# Altium integrated library Lattice CPLD ispLSI.IntLib: 471 symbols (part 17 of 26)
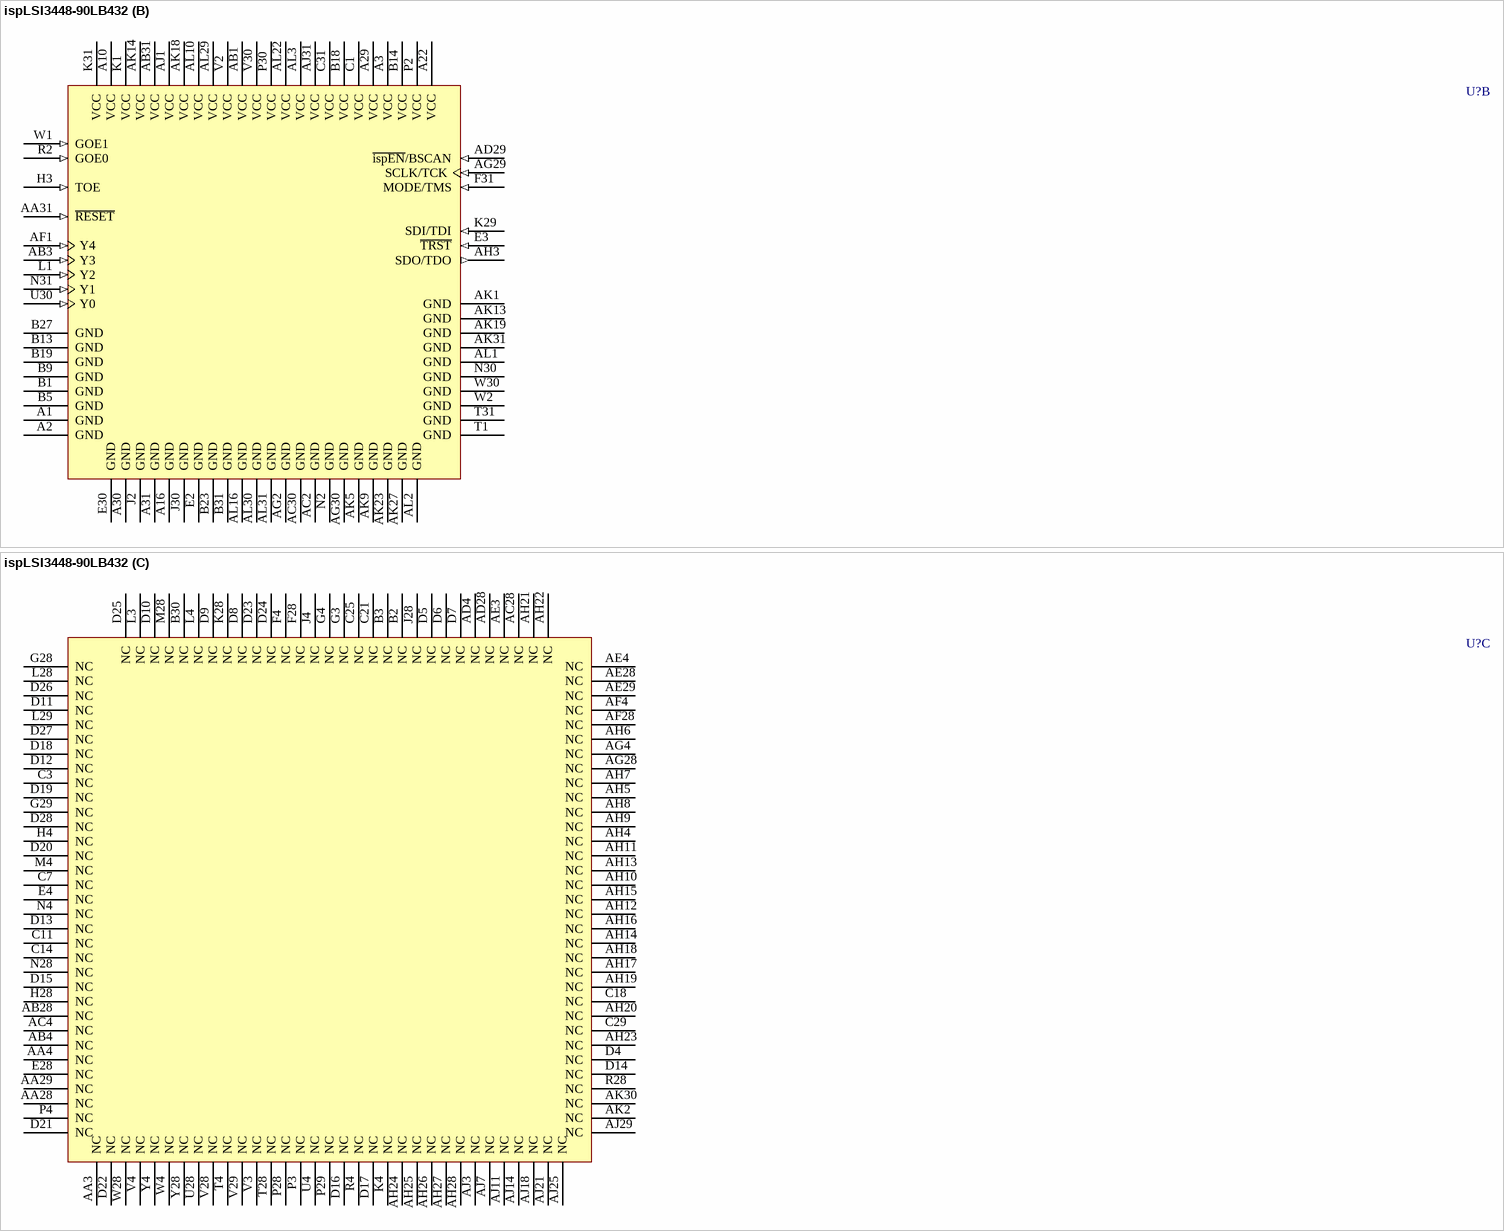
[diagram p247: symbol ispLSI3448-90LB432]

## ispLSI3448-90LB432
designator U?
In-System Programmable High-Density PLD; Published: 23-Sep-2002; LatestRevisionDate: 13-Apr-2006; LatestRevisionNote: IPC-7351 Footprint Added.; DatasheetVersion: Feb-2000; PackageVersion: pkg_32, Aug-2005; PackageReference: SBGA432; Publisher: Altium Limited; PackageDescription: 432-Ball Super Ball Grid Array (SBGA432); ComponentLink1Description: Manufacturer Link; ComponentLink1URL: http://www.latticesemi.com/products/mature/index.cfm; ComponentLink2Description: Datasheet; ComponentLink2URL: http://www.latticesemi.com/lit/docs/datasheets/cpld/3448.pdf
footprint SBGA432 (BGA, 432-Leads, Body 40x40mm, Pitch 1.27mm)
3D model 3448-SBGA432 (432-Ball Super Ball Grid Array (SBGA432))
part A pins: A4 I/O141 (io), A5 I/O142 (io), A6 I/O145 (io), A7 I/O147 (io), A8 I/O150 (io), A9 I/O152 (io), A11 I/O156 (io), A12 I/O159 (io), A13 I/O161 (io), A14 I/O162 (io), A15 I/O165 (io), A17 I/O170 (io), A18 I/O171 (io), A19 I/O172 (io), A20 I/O174 (io), A21 I/O177 (io), A23 I/O181 (io), A24 I/O183 (io), A25 I/O186 (io), A26 I/O188 (io), A27 I/O191 (io), A28 I/O192 (io), AA1 I/O102 (io), AA2 I/O101 (io), AA30 I/O9 (io), AB2 I/O100 (io), AB29 I/O11 (io), AB30 I/O10 (io), AC1 I/O99 (io), AC3 I/O98 (io), AC29 I/O13 (io), AC31 I/O12 (io), AD1 I/O97 (io), AD2 I/O96 (io), AD3 I/O95 (io), AD30 I/O15 (io), AD31 I/O14 (io), AE1 I/O94 (io), AE2 I/O93 (io), AE30 I/O17 (io), AE31 I/O16 (io), AF2 I/O92 (io), AF3 I/O91 (io), AF29 I/O20 (io), AF30 I/O19 (io), AF31 I/O18 (io), AG1 I/O90 (io), AG3 I/O88 (io), AG31 I/O21 (io), AH1 I/O89 (io), AH2 I/O87 (io), AH29 I/O25 (io), AH30 I/O23 (io), AH31 I/O22 (io), AJ2 I/O86 (io), AJ4 I/O85 (io), AJ5 I/O82 (io), AJ6 I/O79 (io), AJ8 I/O74 (io), AJ9 I/O71 (io), AJ10 I/O69 (io), AJ12 I/O65 (io), AJ13 I/O62 (io), AJ15 I/O57 (io), AJ16 I/O55 (io), AJ17 I/O52 (io), AJ19 I/O49 (io), AJ20 I/O46 (io), AJ22 I/O42 (io), AJ23 I/O40 (io), AJ24 I/O37 (io), AJ26 I/O32 (io), AJ27 I/O29 (io), AJ28 I/O26 (io), AJ30 I/O24 (io), AK3 I/O84 (io), AK4 I/O83 (io), AK6 I/O78 (io), AK7 I/O76 (io), AK8 I/O73 (io), AK10 I/O68 (io), AK11 I/O67 (io), AK12 I/O64 (io), AK15 I/O58 (io), AK16 I/O56 (io), AK17 I/O53 (io), AK20 I/O47 (io), AK21 I/O44 (io), AK22 I/O43 (io), AK24 I/O38 (io), AK25 I/O35 (io), AK26 I/O33 (io), AK28 I/O28 (io), AK29 I/O27 (io), AL4 I/O81 (io), AL5 I/O80 (io), AL6 I/O77 (io), AL7 I/O75 (io), AL8 I/O72 (io), AL9 I/O70 (io), AL11 I/O66 (io), AL12 I/O63 (io), AL13 I/O61 (io), AL14 I/O60 (io), AL15 I/O59 (io), AL17 I/O54 (io), AL18 I/O51 (io), AL19 I/O50 (io), AL20 I/O48 (io), AL21 I/O45 (io), AL23 I/O41 (io), AL24 I/O39 (io), AL25 I/O36 (io), AL26 I/O34 (io), AL27 I/O31 (io), AL28 I/O30 (io), B4 I/O139 (io), B6 I/O144 (io), B7 I/O146 (io), B8 I/O149 (io), B10 I/O154 (io), B11 I/O155 (io), B12 I/O158 (io), B15 I/O164 (io), B16 I/O167 (io), B17 I/O169 (io), B20 I/O175 (io), B21 I/O178 (io), B22 I/O179 (io), B24 I/O184 (io), B25 I/O187 (io), B26 I/O189 (io), B28 I/O194 (io), B29 I/O195 (io), C2 I/O136 (io), C4 I/O138 (io), C5 I/O140 (io), C6 I/O143 (io), C8 I/O148 (io), C9 I/O151 (io), C10 I/O153 (io), C12 I/O157 (io), C13 I/O160 (io), C15 I/O163 (io), C16 I/O166 (io), C17 I/O168 (io), C19 I/O173 (io), C20 I/O176 (io), C22 I/O180 (io), C23 I/O182 (io), C24 I/O185 (io), C26 I/O190 (io), C27 I/O193 (io), C28 I/O196 (io), C30 I/O198 (io), D1 I/O134 (io), D2 I/O135 (io), D3 I/O137 (io), D29 I/O197 (io), D30 I/O199 (io), D31 I/O201 (io), E1 I/O133 (io), E29 I/O200 (io), E31 I/O202 (io), F1 I/O130 (io), F2 I/O131 (io), F3 I/O132 (io), F29 I/O203 (io), F30 I/O204 (io), G1 I/O128 (io), G2 I/O129 (io), G30 I/O205 (io), G31 I/O206 (io), H1 I/O126 (io), H2 I/O127 (io), H29 I/O207 (io), H30 I/O208 (io), H31 I/O209 (io), J1 I/O124 (io), J3 I/O125 (io), J29 I/O210 (io), J31 I/O211 (io), K2 I/O122 (io), K3 I/O123 (io), K30 I/O212 (io), L2 I/O121 (io), L30 I/O213 (io), L31 I/O214 (io), M1 I/O118 (io), M2 I/O119 (io), M3 I/O120 (io), M29 I/O215 (io), M30 I/O216 (io), M31 I/O217 (io), N1 I/O116 (io), N3 I/O117 (io), N29 I/O218 (io), P1 I/O115 (io), P31 I/O219 (io), R1 I/O114 (io), R3 I/O113 (io), R29 I/O220 (io), R30 I/O221 (io), R31 I/O222 (io), T2 I/O112 (io), T3 I/O111 (io), T29 I/O223 (io), T30 I/O0 (io), U1 I/O110 (io), U2 I/O109 (io), U3 I/O108 (io), U29 I/O1 (io), U31 I/O2 (io), V1 I/O107 (io), V31 I/O3 (io), W3 I/O106 (io), W29 I/O5 (io), W31 I/O4 (io), Y1 I/O105 (io), Y2 I/O104 (io), Y3 I/O103 (io), Y29 I/O8 (io), Y30 I/O7 (io), Y31 I/O6 (io)
part B pins: A1 GND (power), A2 GND (power), A3 VCC (power), A10 VCC (power), A16 GND (power), A22 VCC (power), A29 VCC (power), A30 GND (power), A31 GND (power), AA31 ~{RESET} (in), AB1 VCC (power), AB3 Y3 (in), AB31 VCC (power), AC2 GND (power), AC30 GND (power), AD29 ~{ispEN}/BSCAN (in), AF1 Y4 (in), AG2 GND (power), AG29 SCLK/TCK (in), AG30 GND (power), AH3 SDO/TDO (out), AJ1 VCC (power), AJ31 VCC (power), AK1 GND (power), AK5 GND (power), AK9 GND (power), AK13 GND (power), AK14 VCC (power), AK18 VCC (power), AK19 GND (power), AK23 GND (power), AK27 GND (power), AK31 GND (power), AL1 GND (power), AL2 GND (power), AL3 VCC (power), AL10 VCC (power), AL16 GND (power), AL22 VCC (power), AL29 VCC (power), AL30 GND (power), AL31 GND (power), B1 GND (power), B5 GND (power), B9 GND (power), B13 GND (power), B14 VCC (power), B18 VCC (power), B19 GND (power), B23 GND (power), B27 GND (power), B31 GND (power), C1 VCC (power), C31 VCC (power), E2 GND (power), E3 ~{TRST} (in), E30 GND (power), F31 MODE/TMS (in), H3 TOE (in), J2 GND (power), J30 GND (power), K1 VCC (power), K29 SDI/TDI (in), K31 VCC (power), L1 Y2 (in), N2 GND (power), N30 GND (power), N31 Y1 (in), P2 VCC (power), P30 VCC (power), R2 GOE0 (in), T1 GND (power), T31 GND (power), U30 Y0 (in), V2 VCC (power), V30 VCC (power), W1 GOE1 (in), W2 GND (power), W30 GND (power)
part C pins: AA3 NC, AA4 NC, AA28 NC, AA29 NC, AB4 NC, AB28 NC, AC4 NC, AC28 NC, AD4 NC, AD28 NC, AE3 NC, AE4 NC, AE28 NC, AE29 NC, AF4 NC, AF28 NC, AG4 NC, AG28 NC, AH4 NC, AH5 NC, AH6 NC, AH7 NC, AH8 NC, AH9 NC, AH10 NC, AH11 NC, AH12 NC, AH13 NC, AH14 NC, AH15 NC, AH16 NC, AH17 NC, AH18 NC, AH19 NC, AH20 NC, AH21 NC, AH22 NC, AH23 NC, AH24 NC, AH25 NC, AH26 NC, AH27 NC, AH28 NC, AJ3 NC, AJ7 NC, AJ11 NC, AJ14 NC, AJ18 NC, AJ21 NC, AJ25 NC, AJ29 NC, AK2 NC, AK30 NC, B2 NC, B3 NC, B30 NC, C3 NC, C7 NC, C11 NC, C14 NC, C18 NC, C21 NC, C25 NC, C29 NC, D4 NC, D5 NC, D6 NC, D7 NC, D8 NC, D9 NC, D10 NC, D11 NC, D12 NC, D13 NC, D14 NC, D15 NC, D16 NC, D17 NC, D18 NC, D19 NC, D20 NC, D21 NC, D22 NC, D23 NC, D24 NC, D25 NC, D26 NC, D27 NC, D28 NC, E4 NC, E28 NC, F4 NC, F28 NC, G3 NC, G4 NC, G28 NC, G29 NC, H4 NC, H28 NC, J4 NC, J28 NC, K4 NC, K28 NC, L3 NC, L4 NC, L28 NC, L29 NC, M4 NC, M28 NC, N4 NC, N28 NC, P3 NC, P4 NC, P28 NC, P29 NC, R4 NC, R28 NC, T4 NC, T28 NC, U4 NC, U28 NC, V3 NC, V4 NC, V28 NC, V29 NC, W4 NC, W28 NC, Y4 NC, Y28 NC
part A text: N; M; L; K; A; J; B; I; C; H; D; E; F; G

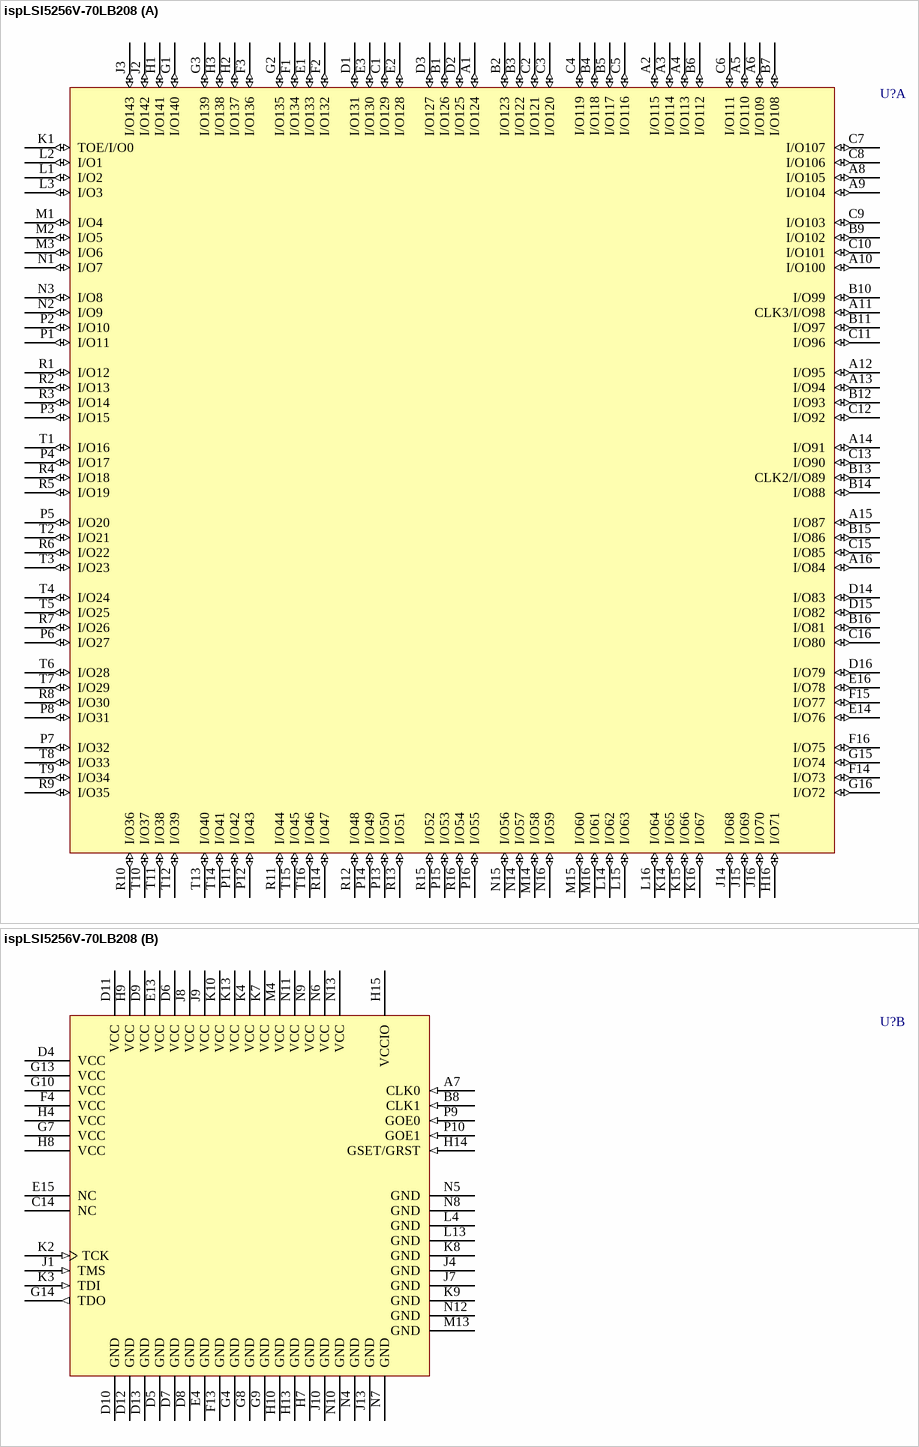
[diagram p159: symbol ispLSI5256V-70LB208]

## ispLSI5256V-70LB208
designator U?
In-System Programmable 3.3V SuperWIDE High-Density PLD; Note: I/O89 is multiplexed with CLK2; I/O98 is multiplexed with CLK3; I/O0 is multiplexed with TOE.; Published: 23-Sep-2002; LatestRevisionDate: 13-Apr-2006; LatestRevisionNote: IPC-7351 Footprint Added.; DatasheetVersion: May-1999; PackageVersion: pkg_32, Aug-2005; PackageReference: fpBGA208; Publisher: Altium Limited; PackageDescription: 208-Ball Fine Pitch Ball Grid Array (fpBGA208); ComponentLink1Description: Manufacturer Link; ComponentLink1URL: http://www.latticesemi.com/products/mature/index.cfm; ComponentLink2Description: Datasheet; ComponentLink2URL: http://www.latticesemi.com/account/_download.cfm?AMID=1164
footprint fpBGA208 (BGA, 208-Leads, Body 17x17mm, Pitch 1mm)
3D model 5256V-fpBGA208 (208-Ball Fine Pitch Ball Grid Array (fpBGA208))
part A pins: A1 I/O124 (io), A2 I/O115 (io), A3 I/O114 (io), A4 I/O113 (io), A5 I/O110 (io), A6 I/O109 (io), A8 I/O105 (io), A9 I/O104 (io), A10 I/O100 (io), A11 CLK3/I/O98 (io), A12 I/O95 (io), A13 I/O94 (io), A14 I/O91 (io), A15 I/O87 (io), A16 I/O84 (io), B1 I/O126 (io), B2 I/O123 (io), B3 I/O122 (io), B4 I/O118 (io), B5 I/O117 (io), B6 I/O112 (io), B7 I/O108 (io), B9 I/O102 (io), B10 I/O99 (io), B11 I/O97 (io), B12 I/O93 (io), B13 CLK2/I/O89 (io), B14 I/O88 (io), B15 I/O86 (io), B16 I/O81 (io), C1 I/O129 (io), C2 I/O121 (io), C3 I/O120 (io), C4 I/O119 (io), C5 I/O116 (io), C6 I/O111 (io), C7 I/O107 (io), C8 I/O106 (io), C9 I/O103 (io), C10 I/O101 (io), C11 I/O96 (io), C12 I/O92 (io), C13 I/O90 (io), C15 I/O85 (io), C16 I/O80 (io), D1 I/O131 (io), D2 I/O125 (io), D3 I/O127 (io), D14 I/O83 (io), D15 I/O82 (io), D16 I/O79 (io), E1 I/O133 (io), E2 I/O128 (io), E3 I/O130 (io), E14 I/O76 (io), E16 I/O78 (io), F1 I/O134 (io), F2 I/O132 (io), F3 I/O136 (io), F14 I/O73 (io), F15 I/O77 (io), F16 I/O75 (io), G1 I/O140 (io), G2 I/O135 (io), G3 I/O139 (io), G15 I/O74 (io), G16 I/O72 (io), H1 I/O141 (io), H2 I/O137 (io), H3 I/O138 (io), H16 I/O71 (io), J2 I/O142 (io), J3 I/O143 (io), J14 I/O68 (io), J15 I/O69 (io), J16 I/O70 (io), K1 TOE/I/O0 (io), K14 I/O65 (io), K15 I/O66 (io), K16 I/O67 (io), L1 I/O2 (io), L2 I/O1 (io), L3 I/O3 (io), L14 I/O62 (io), L15 I/O63 (io), L16 I/O64 (io), M1 I/O4 (io), M2 I/O5 (io), M3 I/O6 (io), M14 I/O58 (io), M15 I/O60 (io), M16 I/O61 (io), N1 I/O7 (io), N2 I/O9 (io), N3 I/O8 (io), N14 I/O57 (io), N15 I/O56 (io), N16 I/O59 (io), P1 I/O11 (io), P2 I/O10 (io), P3 I/O15 (io), P4 I/O17 (io), P5 I/O20 (io), P6 I/O27 (io), P7 I/O32 (io), P8 I/O31 (io), P11 I/O42 (io), P12 I/O43 (io), P13 I/O50 (io), P14 I/O49 (io), P15 I/O53 (io), P16 I/O55 (io), R1 I/O12 (io), R2 I/O13 (io), R3 I/O14 (io), R4 I/O18 (io), R5 I/O19 (io), R6 I/O22 (io), R7 I/O26 (io), R8 I/O30 (io), R9 I/O35 (io), R10 I/O36 (io), R11 I/O44 (io), R12 I/O48 (io), R13 I/O51 (io), R14 I/O47 (io), R15 I/O52 (io), R16 I/O54 (io), T1 I/O16 (io), T2 I/O21 (io), T3 I/O23 (io), T4 I/O24 (io), T5 I/O25 (io), T6 I/O28 (io), T7 I/O29 (io), T8 I/O33 (io), T9 I/O34 (io), T10 I/O37 (io), T11 I/O38 (io), T12 I/O39 (io), T13 I/O40 (io), T14 I/O41 (io), T15 I/O45 (io), T16 I/O46 (io)
part B pins: A7 CLK0 (in), B8 CLK1 (in), C14 NC, D4 VCC (power), D5 GND (power), D6 VCC (power), D7 GND (power), D8 GND (power), D9 VCC (power), D10 GND (power), D11 VCC (power), D12 GND (power), D13 GND (power), E4 GND (power), E13 VCC (power), E15 NC, F4 VCC (power), F13 GND (power), G4 GND (power), G7 VCC (power), G8 GND (power), G9 GND (power), G10 VCC (power), G13 VCC (power), G14 TDO (out), H4 VCC (power), H7 GND (power), H8 VCC (power), H9 VCC (power), H10 GND (power), H13 GND (power), H14 GSET/GRST (in), H15 VCCIO (power), J1 TMS (in), J4 GND (power), J7 GND (power), J8 VCC (power), J9 VCC (power), J10 GND (power), J13 GND (power), K2 TCK (in), K3 TDI (in), K4 VCC (power), K7 VCC (power), K8 GND (power), K9 GND (power), K10 VCC (power), K13 VCC (power), L4 GND (power), L13 GND (power), M4 VCC (power), M13 GND (power), N4 GND (power), N5 GND (power), N6 VCC (power), N7 GND (power), N8 GND (power), N9 VCC (power), N10 GND (power), N11 VCC (power), N12 GND (power), N13 VCC (power), P9 GOE0 (in), P10 GOE1 (in)

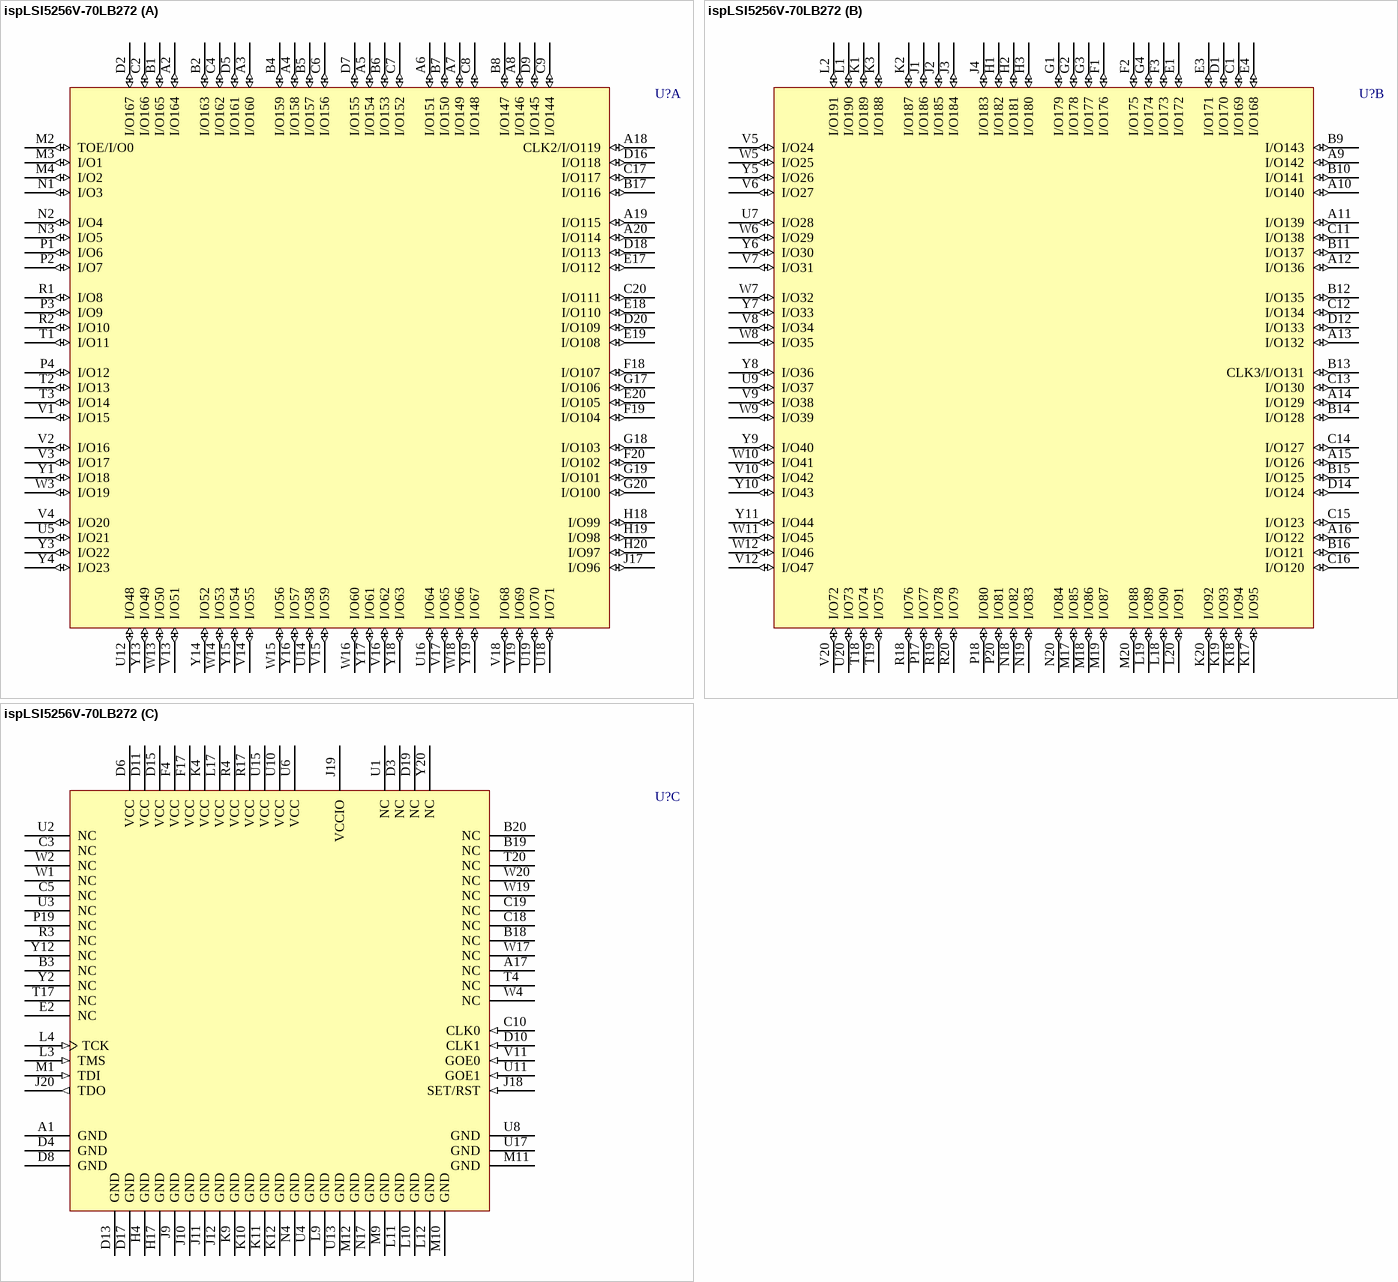
[diagram p160: symbol ispLSI5256V-70LB272]

## ispLSI5256V-70LB272
designator U?
In-System Programmable 3.3V SuperWIDE High-Density PLD; Note: I/O119 is multiplexed with CLK2; I/O131 is multiplexed with CLK3; I/O0 is multiplexed with TOE.; Published: 23-Sep-2002; LatestRevisionDate: 13-Apr-2006; LatestRevisionNote: IPC-7351 Footprint Added.; DatasheetVersion: May-1999; PackageVersion: pkg_32, Aug-2005; PackageReference: BGA272; Publisher: Altium Limited; PackageDescription: 272-Ball Ball Grid Array (BGA272); ComponentLink1Description: Manufacturer Link; ComponentLink1URL: http://www.latticesemi.com/products/mature/index.cfm; ComponentLink2Description: Datasheet; ComponentLink2URL: http://www.latticesemi.com/account/_download.cfm?AMID=1164
footprint BGA272 (BGA, 272-Leads, Body 27x27mm, Pitch 1.27mm)
3D model 5256V-BGA272 (272-Ball Ball Grid Array (BGA272))
part A pins: A2 I/O164 (io), A3 I/O160 (io), A4 I/O158 (io), A5 I/O154 (io), A6 I/O151 (io), A7 I/O149 (io), A8 I/O146 (io), A18 CLK2/I/O119 (io), A19 I/O115 (io), A20 I/O114 (io), B1 I/O165 (io), B2 I/O163 (io), B4 I/O159 (io), B5 I/O157 (io), B6 I/O153 (io), B7 I/O150 (io), B8 I/O147 (io), B17 I/O116 (io), C2 I/O166 (io), C4 I/O162 (io), C6 I/O156 (io), C7 I/O152 (io), C8 I/O148 (io), C9 I/O144 (io), C17 I/O117 (io), C20 I/O111 (io), D2 I/O167 (io), D5 I/O161 (io), D7 I/O155 (io), D9 I/O145 (io), D16 I/O118 (io), D18 I/O113 (io), D20 I/O109 (io), E17 I/O112 (io), E18 I/O110 (io), E19 I/O108 (io), E20 I/O105 (io), F18 I/O107 (io), F19 I/O104 (io), F20 I/O102 (io), G17 I/O106 (io), G18 I/O103 (io), G19 I/O101 (io), G20 I/O100 (io), H18 I/O99 (io), H19 I/O98 (io), H20 I/O97 (io), J17 I/O96 (io), M2 TOE/I/O0 (io), M3 I/O1 (io), M4 I/O2 (io), N1 I/O3 (io), N2 I/O4 (io), N3 I/O5 (io), P1 I/O6 (io), P2 I/O7 (io), P3 I/O9 (io), P4 I/O12 (io), R1 I/O8 (io), R2 I/O10 (io), T1 I/O11 (io), T2 I/O13 (io), T3 I/O14 (io), U5 I/O21 (io), U12 I/O48 (io), U14 I/O58 (io), U16 I/O64 (io), U18 I/O71 (io), U19 I/O70 (io), V1 I/O15 (io), V2 I/O16 (io), V3 I/O17 (io), V4 I/O20 (io), V13 I/O51 (io), V14 I/O55 (io), V15 I/O59 (io), V16 I/O62 (io), V17 I/O65 (io), V18 I/O68 (io), V19 I/O69 (io), W3 I/O19 (io), W13 I/O50 (io), W14 I/O53 (io), W15 I/O56 (io), W16 I/O60 (io), W18 I/O66 (io), Y1 I/O18 (io), Y3 I/O22 (io), Y4 I/O23 (io), Y13 I/O49 (io), Y14 I/O52 (io), Y15 I/O54 (io), Y16 I/O57 (io), Y17 I/O61 (io), Y18 I/O63 (io), Y19 I/O67 (io)
part B pins: A9 I/O142 (io), A10 I/O140 (io), A11 I/O139 (io), A12 I/O136 (io), A13 I/O132 (io), A14 I/O129 (io), A15 I/O126 (io), A16 I/O122 (io), B9 I/O143 (io), B10 I/O141 (io), B11 I/O137 (io), B12 I/O135 (io), B13 CLK3/I/O131 (io), B14 I/O128 (io), B15 I/O125 (io), B16 I/O121 (io), C1 I/O169 (io), C11 I/O138 (io), C12 I/O134 (io), C13 I/O130 (io), C14 I/O127 (io), C15 I/O123 (io), C16 I/O120 (io), D1 I/O170 (io), D12 I/O133 (io), D14 I/O124 (io), E1 I/O172 (io), E3 I/O171 (io), E4 I/O168 (io), F1 I/O176 (io), F2 I/O175 (io), F3 I/O173 (io), G1 I/O179 (io), G2 I/O178 (io), G3 I/O177 (io), G4 I/O174 (io), H1 I/O182 (io), H2 I/O181 (io), H3 I/O180 (io), J1 I/O186 (io), J2 I/O185 (io), J3 I/O184 (io), J4 I/O183 (io), K1 I/O189 (io), K2 I/O187 (io), K3 I/O188 (io), K17 I/O95 (io), K18 I/O94 (io), K19 I/O93 (io), K20 I/O92 (io), L1 I/O190 (io), L2 I/O191 (io), L18 I/O90 (io), L19 I/O89 (io), L20 I/O91 (io), M17 I/O85 (io), M18 I/O86 (io), M19 I/O87 (io), M20 I/O88 (io), N18 I/O82 (io), N19 I/O83 (io), N20 I/O84 (io), P17 I/O77 (io), P18 I/O80 (io), P20 I/O81 (io), R18 I/O76 (io), R19 I/O78 (io), R20 I/O79 (io), T18 I/O74 (io), T19 I/O75 (io), U7 I/O28 (io), U9 I/O37 (io), U20 I/O73 (io), V5 I/O24 (io), V6 I/O27 (io), V7 I/O31 (io), V8 I/O34 (io), V9 I/O38 (io), V10 I/O42 (io), V12 I/O47 (io), V20 I/O72 (io), W5 I/O25 (io), W6 I/O29 (io), W7 I/O32 (io), W8 I/O35 (io), W9 I/O39 (io), W10 I/O41 (io), W11 I/O45 (io), W12 I/O46 (io), Y5 I/O26 (io), Y6 I/O30 (io), Y7 I/O33 (io), Y8 I/O36 (io), Y9 I/O40 (io), Y10 I/O43 (io), Y11 I/O44 (io)
part C pins: A1 GND (power), A17 NC, B3 NC, B18 NC, B19 NC, B20 NC, C3 NC, C5 NC, C10 CLK0 (in), C18 NC, C19 NC, D3 NC, D4 GND (power), D6 VCC (power), D8 GND (power), D10 CLK1 (in), D11 VCC (power), D13 GND (power), D15 VCC (power), D17 GND (power), D19 NC, E2 NC, F4 VCC (power), F17 VCC (power), H4 GND (power), H17 GND (power), J9 GND (power), J10 GND (power), J11 GND (power), J12 GND (power), J18 SET/RST (in), J19 VCCIO (power), J20 TDO (out), K4 VCC (power), K9 GND (power), K10 GND (power), K11 GND (power), K12 GND (power), L3 TMS (in), L4 TCK (in), L9 GND (power), L10 GND (power), L11 GND (power), L12 GND (power), L17 VCC (power), M1 TDI (in), M9 GND (power), M10 GND (power), M11 GND (power), M12 GND (power), N4 GND (power), N17 GND (power), P19 NC, R3 NC, R4 VCC (power), R17 VCC (power), T4 NC, T17 NC, T20 NC, U1 NC, U2 NC, U3 NC, U4 GND (power), U6 VCC (power), U8 GND (power), U10 VCC (power), U11 GOE1 (in), U13 GND (power), U15 VCC (power), U17 GND (power), V11 GOE0 (in), W1 NC, W2 NC, W4 NC, W17 NC, W19 NC, W20 NC, Y2 NC, Y12 NC, Y20 NC

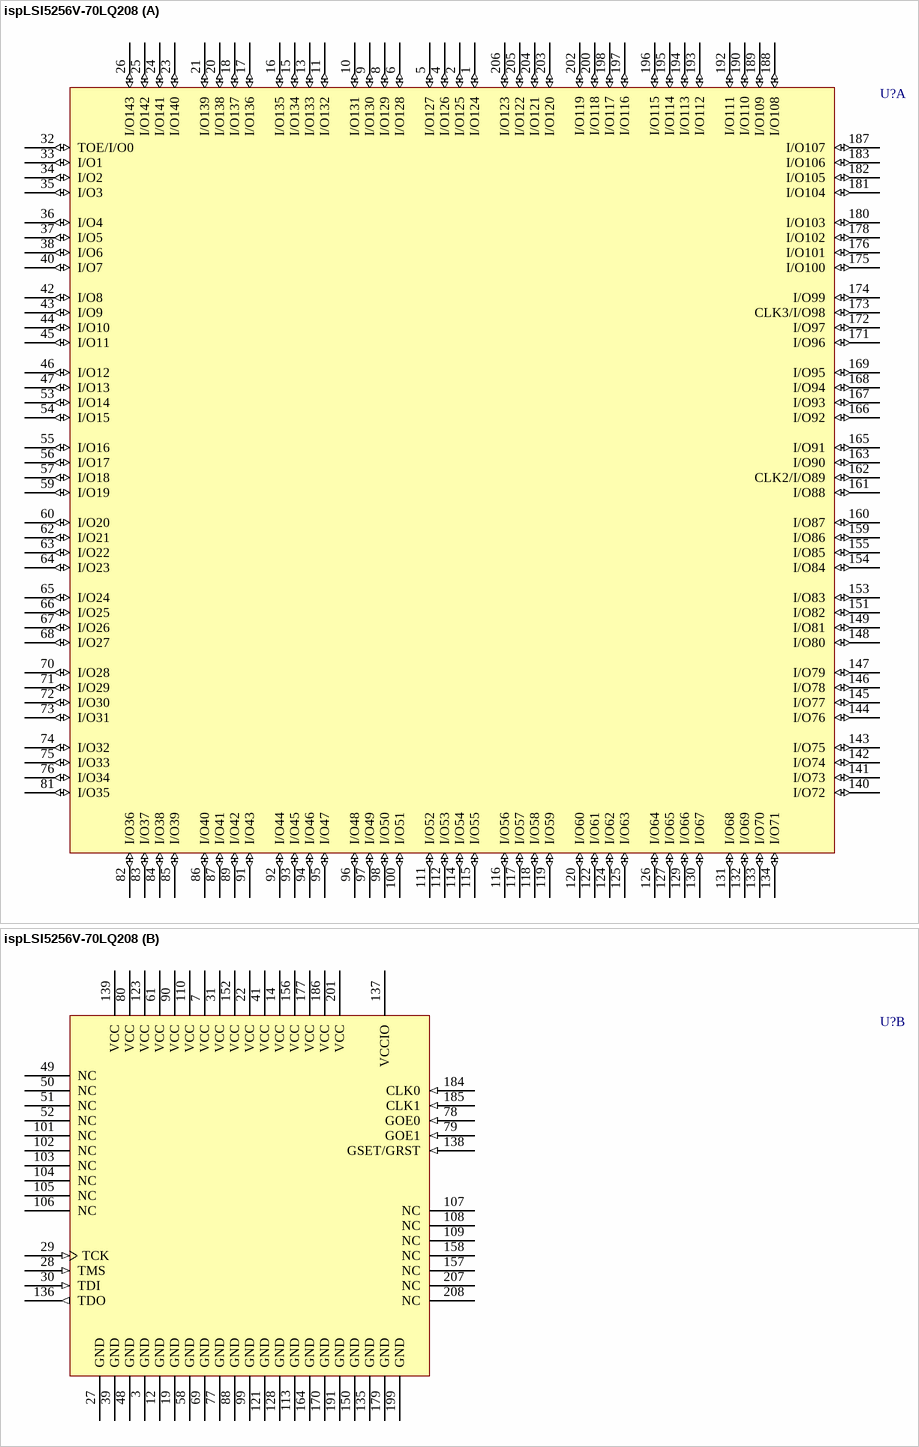
[diagram p161: symbol ispLSI5256V-70LQ208]

## ispLSI5256V-70LQ208
designator U?
In-System Programmable 3.3V SuperWIDE High-Density PLD; Note: I/O89 is multiplexed with CLK2; I/O98 is multiplexed with CLK3; I/O0 is multiplexed with TOE.; Published: 23-Sep-2002; LatestRevisionDate: 13-Apr-2006; LatestRevisionNote: IPC-7351 Footprint Added.; DatasheetVersion: May-1999; PackageVersion: pkg_32, Aug-2005; PackageReference: PQFP208; Publisher: Altium Limited; PackageDescription: 208-Pin Plastic Quad Flat Pack (PQFP208); Code_JEDEC: MO-143-FAI; ComponentLink1Description: Manufacturer Link; ComponentLink1URL: http://www.latticesemi.com/products/mature/index.cfm; ComponentLink2Description: Datasheet; ComponentLink2URL: http://www.latticesemi.com/account/_download.cfm?AMID=1164
footprint PQFP208_N (Shrink QFP, 208-Leads, Body 28x28mm, Pitch 0.5mm, IPC Medium Density)
footprint PQFP208_L (Shrink QFP, 208-Leads, Body 28x28mm, Pitch 0.5mm, IPC High Density)
footprint PQFP208_M (Shrink QFP, 208-Leads, Body 28x28mm, Pitch 0.5mm, IPC Low Density)
3D model 5256V-PQFP208 (208-Pin Plastic Quad Flat Pack (PQFP208))
part A pins: 1 I/O124 (io), 2 I/O125 (io), 4 I/O126 (io), 5 I/O127 (io), 6 I/O128 (io), 8 I/O129 (io), 9 I/O130 (io), 10 I/O131 (io), 11 I/O132 (io), 13 I/O133 (io), 15 I/O134 (io), 16 I/O135 (io), 17 I/O136 (io), 18 I/O137 (io), 20 I/O138 (io), 21 I/O139 (io), 23 I/O140 (io), 24 I/O141 (io), 25 I/O142 (io), 26 I/O143 (io), 32 TOE/I/O0 (io), 33 I/O1 (io), 34 I/O2 (io), 35 I/O3 (io), 36 I/O4 (io), 37 I/O5 (io), 38 I/O6 (io), 40 I/O7 (io), 42 I/O8 (io), 43 I/O9 (io), 44 I/O10 (io), 45 I/O11 (io), 46 I/O12 (io), 47 I/O13 (io), 53 I/O14 (io), 54 I/O15 (io), 55 I/O16 (io), 56 I/O17 (io), 57 I/O18 (io), 59 I/O19 (io), 60 I/O20 (io), 62 I/O21 (io), 63 I/O22 (io), 64 I/O23 (io), 65 I/O24 (io), 66 I/O25 (io), 67 I/O26 (io), 68 I/O27 (io), 70 I/O28 (io), 71 I/O29 (io), 72 I/O30 (io), 73 I/O31 (io), 74 I/O32 (io), 75 I/O33 (io), 76 I/O34 (io), 81 I/O35 (io), 82 I/O36 (io), 83 I/O37 (io), 84 I/O38 (io), 85 I/O39 (io), 86 I/O40 (io), 87 I/O41 (io), 89 I/O42 (io), 91 I/O43 (io), 92 I/O44 (io), 93 I/O45 (io), 94 I/O46 (io), 95 I/O47 (io), 96 I/O48 (io), 97 I/O49 (io), 98 I/O50 (io), 100 I/O51 (io), 111 I/O52 (io), 112 I/O53 (io), 114 I/O54 (io), 115 I/O55 (io), 116 I/O56 (io), 117 I/O57 (io), 118 I/O58 (io), 119 I/O59 (io), 120 I/O60 (io), 122 I/O61 (io), 124 I/O62 (io), 125 I/O63 (io), 126 I/O64 (io), 127 I/O65 (io), 129 I/O66 (io), 130 I/O67 (io), 131 I/O68 (io), 132 I/O69 (io), 133 I/O70 (io), 134 I/O71 (io), 140 I/O72 (io), 141 I/O73 (io), 142 I/O74 (io), 143 I/O75 (io), 144 I/O76 (io), 145 I/O77 (io), 146 I/O78 (io), 147 I/O79 (io), 148 I/O80 (io), 149 I/O81 (io), 151 I/O82 (io), 153 I/O83 (io), 154 I/O84 (io), 155 I/O85 (io), 159 I/O86 (io), 160 I/O87 (io), 161 I/O88 (io), 162 CLK2/I/O89 (io), 163 I/O90 (io), 165 I/O91 (io), 166 I/O92 (io), 167 I/O93 (io), 168 I/O94 (io), 169 I/O95 (io), 171 I/O96 (io), 172 I/O97 (io), 173 CLK3/I/O98 (io), 174 I/O99 (io), 175 I/O100 (io), 176 I/O101 (io), 178 I/O102 (io), 180 I/O103 (io), 181 I/O104 (io), 182 I/O105 (io), 183 I/O106 (io), 187 I/O107 (io), 188 I/O108 (io), 189 I/O109 (io), 190 I/O110 (io), 192 I/O111 (io), 193 I/O112 (io), 194 I/O113 (io), 195 I/O114 (io), 196 I/O115 (io), 197 I/O116 (io), 198 I/O117 (io), 200 I/O118 (io), 202 I/O119 (io), 203 I/O120 (io), 204 I/O121 (io), 205 I/O122 (io), 206 I/O123 (io)
part B pins: 3 GND (power), 7 VCC (power), 12 GND (power), 14 VCC (power), 19 GND (power), 22 VCC (power), 27 GND (power), 28 TMS (in), 29 TCK (in), 30 TDI (in), 31 VCC (power), 39 GND (power), 41 VCC (power), 48 GND (power), 49 NC, 50 NC, 51 NC, 52 NC, 58 GND (power), 61 VCC (power), 69 GND (power), 77 GND (power), 78 GOE0 (in), 79 GOE1 (in), 80 VCC (power), 88 GND (power), 90 VCC (power), 99 GND (power), 101 NC, 102 NC, 103 NC, 104 NC, 105 NC, 106 NC, 107 NC, 108 NC, 109 NC, 110 VCC (power), 113 GND (power), 121 GND (power), 123 VCC (power), 128 GND (power), 135 GND (power), 136 TDO (out), 137 VCCIO (power), 138 GSET/GRST (in), 139 VCC (power), 150 GND (power), 152 VCC (power), 156 VCC (power), 157 NC, 158 NC, 164 GND (power), 170 GND (power), 177 VCC (power), 179 GND (power), 184 CLK0 (in), 185 CLK1 (in), 186 VCC (power), 191 GND (power), 199 GND (power), 201 VCC (power), 207 NC, 208 NC

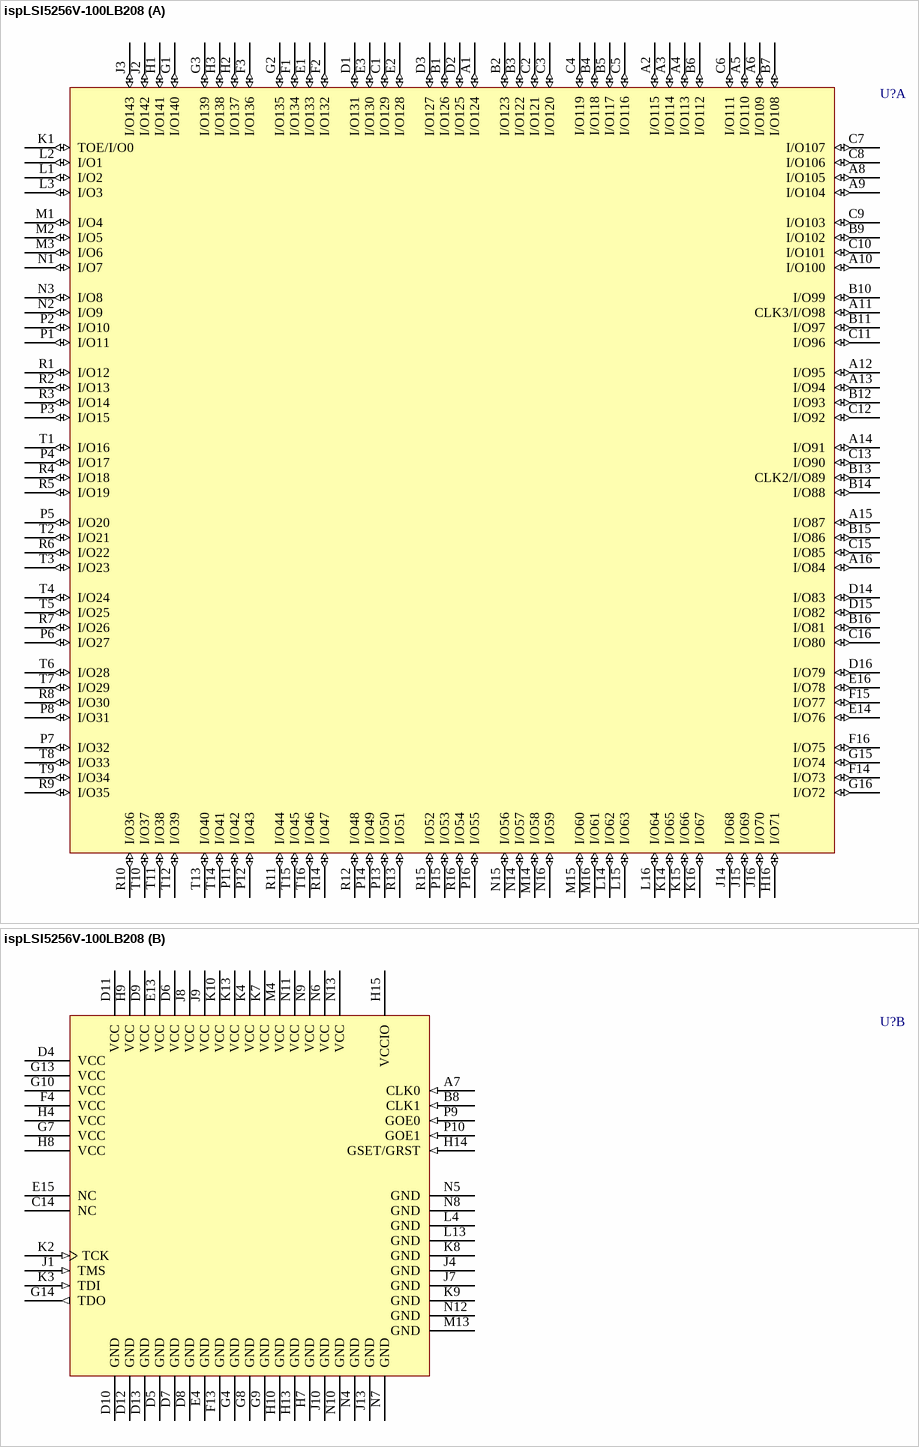
[diagram p162: symbol ispLSI5256V-100LB208]

## ispLSI5256V-100LB208
designator U?
In-System Programmable 3.3V SuperWIDE High-Density PLD; Note: I/O89 is multiplexed with CLK2; I/O98 is multiplexed with CLK3; I/O0 is multiplexed with TOE.; Published: 23-Sep-2002; LatestRevisionDate: 13-Apr-2006; LatestRevisionNote: IPC-7351 Footprint Added.; DatasheetVersion: May-1999; PackageVersion: pkg_32, Aug-2005; PackageReference: fpBGA208; Publisher: Altium Limited; PackageDescription: 208-Ball Fine Pitch Ball Grid Array (fpBGA208); ComponentLink1Description: Manufacturer Link; ComponentLink1URL: http://www.latticesemi.com/products/mature/index.cfm; ComponentLink2Description: Datasheet; ComponentLink2URL: http://www.latticesemi.com/account/_download.cfm?AMID=1164
footprint fpBGA208 (BGA, 208-Leads, Body 17x17mm, Pitch 1mm)
3D model 5256V-fpBGA208 (208-Ball Fine Pitch Ball Grid Array (fpBGA208))
part A pins: A1 I/O124 (io), A2 I/O115 (io), A3 I/O114 (io), A4 I/O113 (io), A5 I/O110 (io), A6 I/O109 (io), A8 I/O105 (io), A9 I/O104 (io), A10 I/O100 (io), A11 CLK3/I/O98 (io), A12 I/O95 (io), A13 I/O94 (io), A14 I/O91 (io), A15 I/O87 (io), A16 I/O84 (io), B1 I/O126 (io), B2 I/O123 (io), B3 I/O122 (io), B4 I/O118 (io), B5 I/O117 (io), B6 I/O112 (io), B7 I/O108 (io), B9 I/O102 (io), B10 I/O99 (io), B11 I/O97 (io), B12 I/O93 (io), B13 CLK2/I/O89 (io), B14 I/O88 (io), B15 I/O86 (io), B16 I/O81 (io), C1 I/O129 (io), C2 I/O121 (io), C3 I/O120 (io), C4 I/O119 (io), C5 I/O116 (io), C6 I/O111 (io), C7 I/O107 (io), C8 I/O106 (io), C9 I/O103 (io), C10 I/O101 (io), C11 I/O96 (io), C12 I/O92 (io), C13 I/O90 (io), C15 I/O85 (io), C16 I/O80 (io), D1 I/O131 (io), D2 I/O125 (io), D3 I/O127 (io), D14 I/O83 (io), D15 I/O82 (io), D16 I/O79 (io), E1 I/O133 (io), E2 I/O128 (io), E3 I/O130 (io), E14 I/O76 (io), E16 I/O78 (io), F1 I/O134 (io), F2 I/O132 (io), F3 I/O136 (io), F14 I/O73 (io), F15 I/O77 (io), F16 I/O75 (io), G1 I/O140 (io), G2 I/O135 (io), G3 I/O139 (io), G15 I/O74 (io), G16 I/O72 (io), H1 I/O141 (io), H2 I/O137 (io), H3 I/O138 (io), H16 I/O71 (io), J2 I/O142 (io), J3 I/O143 (io), J14 I/O68 (io), J15 I/O69 (io), J16 I/O70 (io), K1 TOE/I/O0 (io), K14 I/O65 (io), K15 I/O66 (io), K16 I/O67 (io), L1 I/O2 (io), L2 I/O1 (io), L3 I/O3 (io), L14 I/O62 (io), L15 I/O63 (io), L16 I/O64 (io), M1 I/O4 (io), M2 I/O5 (io), M3 I/O6 (io), M14 I/O58 (io), M15 I/O60 (io), M16 I/O61 (io), N1 I/O7 (io), N2 I/O9 (io), N3 I/O8 (io), N14 I/O57 (io), N15 I/O56 (io), N16 I/O59 (io), P1 I/O11 (io), P2 I/O10 (io), P3 I/O15 (io), P4 I/O17 (io), P5 I/O20 (io), P6 I/O27 (io), P7 I/O32 (io), P8 I/O31 (io), P11 I/O42 (io), P12 I/O43 (io), P13 I/O50 (io), P14 I/O49 (io), P15 I/O53 (io), P16 I/O55 (io), R1 I/O12 (io), R2 I/O13 (io), R3 I/O14 (io), R4 I/O18 (io), R5 I/O19 (io), R6 I/O22 (io), R7 I/O26 (io), R8 I/O30 (io), R9 I/O35 (io), R10 I/O36 (io), R11 I/O44 (io), R12 I/O48 (io), R13 I/O51 (io), R14 I/O47 (io), R15 I/O52 (io), R16 I/O54 (io), T1 I/O16 (io), T2 I/O21 (io), T3 I/O23 (io), T4 I/O24 (io), T5 I/O25 (io), T6 I/O28 (io), T7 I/O29 (io), T8 I/O33 (io), T9 I/O34 (io), T10 I/O37 (io), T11 I/O38 (io), T12 I/O39 (io), T13 I/O40 (io), T14 I/O41 (io), T15 I/O45 (io), T16 I/O46 (io)
part B pins: A7 CLK0 (in), B8 CLK1 (in), C14 NC, D4 VCC (power), D5 GND (power), D6 VCC (power), D7 GND (power), D8 GND (power), D9 VCC (power), D10 GND (power), D11 VCC (power), D12 GND (power), D13 GND (power), E4 GND (power), E13 VCC (power), E15 NC, F4 VCC (power), F13 GND (power), G4 GND (power), G7 VCC (power), G8 GND (power), G9 GND (power), G10 VCC (power), G13 VCC (power), G14 TDO (out), H4 VCC (power), H7 GND (power), H8 VCC (power), H9 VCC (power), H10 GND (power), H13 GND (power), H14 GSET/GRST (in), H15 VCCIO (power), J1 TMS (in), J4 GND (power), J7 GND (power), J8 VCC (power), J9 VCC (power), J10 GND (power), J13 GND (power), K2 TCK (in), K3 TDI (in), K4 VCC (power), K7 VCC (power), K8 GND (power), K9 GND (power), K10 VCC (power), K13 VCC (power), L4 GND (power), L13 GND (power), M4 VCC (power), M13 GND (power), N4 GND (power), N5 GND (power), N6 VCC (power), N7 GND (power), N8 GND (power), N9 VCC (power), N10 GND (power), N11 VCC (power), N12 GND (power), N13 VCC (power), P9 GOE0 (in), P10 GOE1 (in)

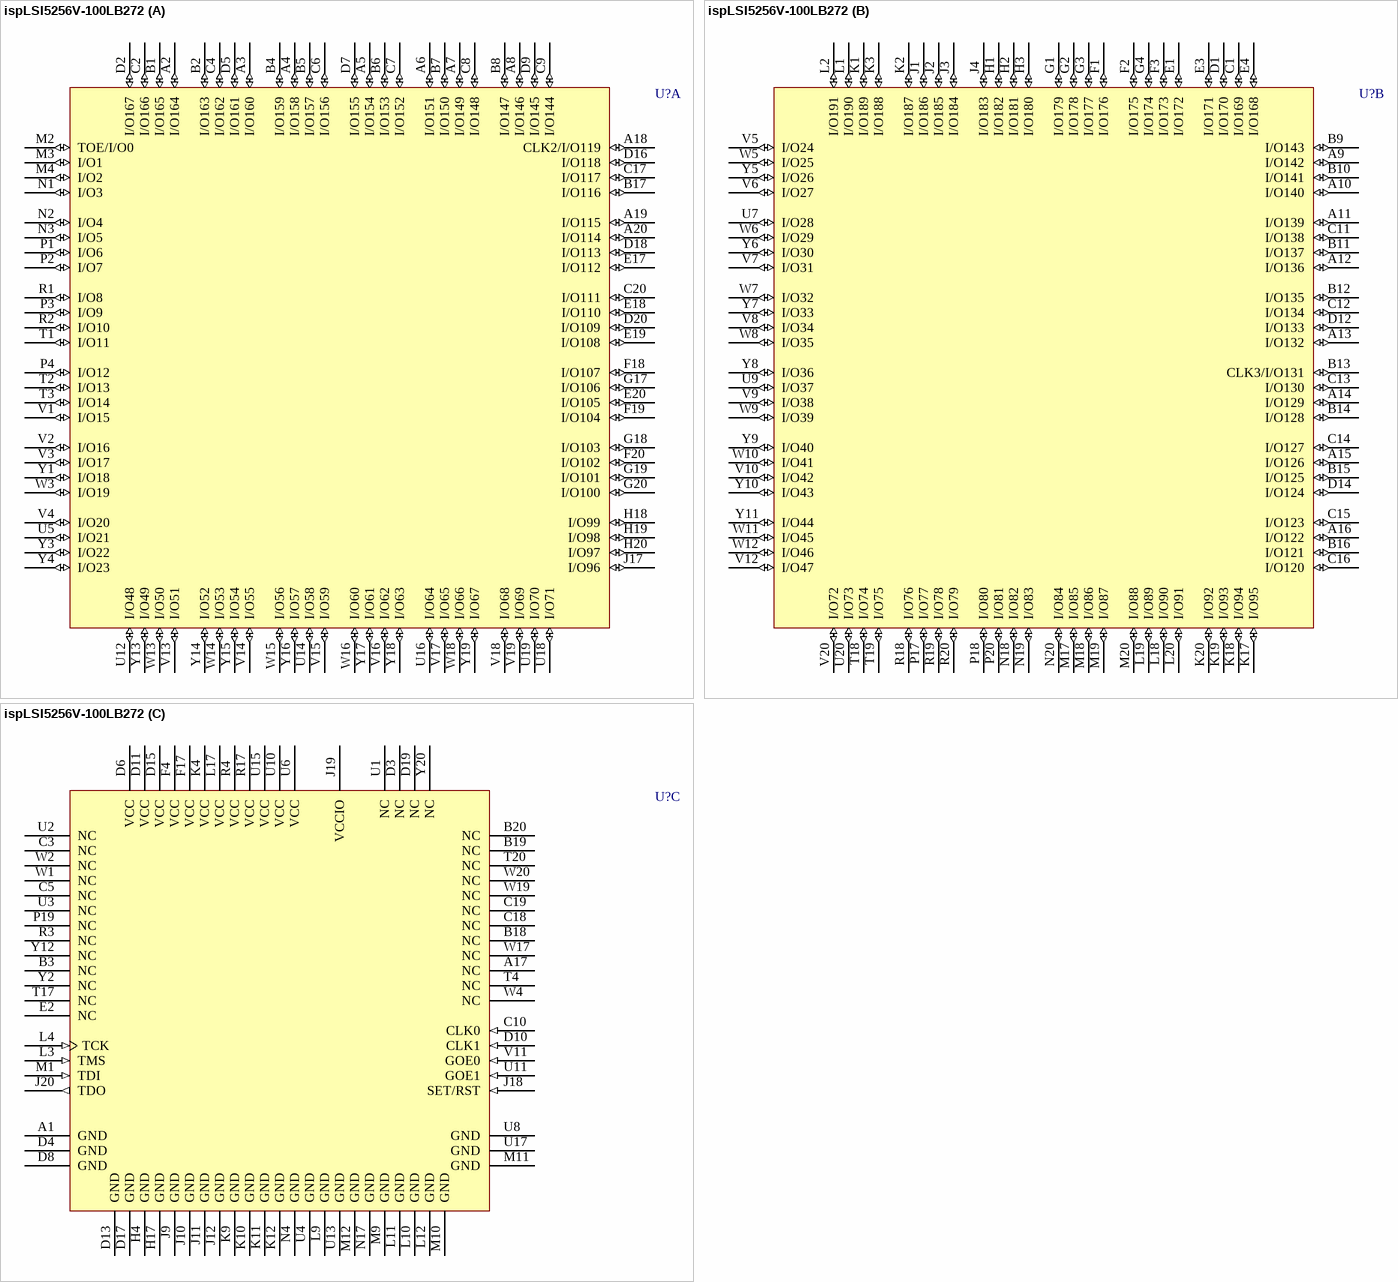
[diagram p163: symbol ispLSI5256V-100LB272]
